# Altium footprint library MyPcbLib.PcbLib: 657 footprints (part 15 of 42)
Each footprint in its own frame and in the unit in brackets; x right, y up, seen from the top. Pads: shape width x height; smd on the part's side, far side on the other; paste and mask are expansions set on the pad; w line width, h text height; cw(c..) or ccw(c..) is an arc to the next point about the centre after c.
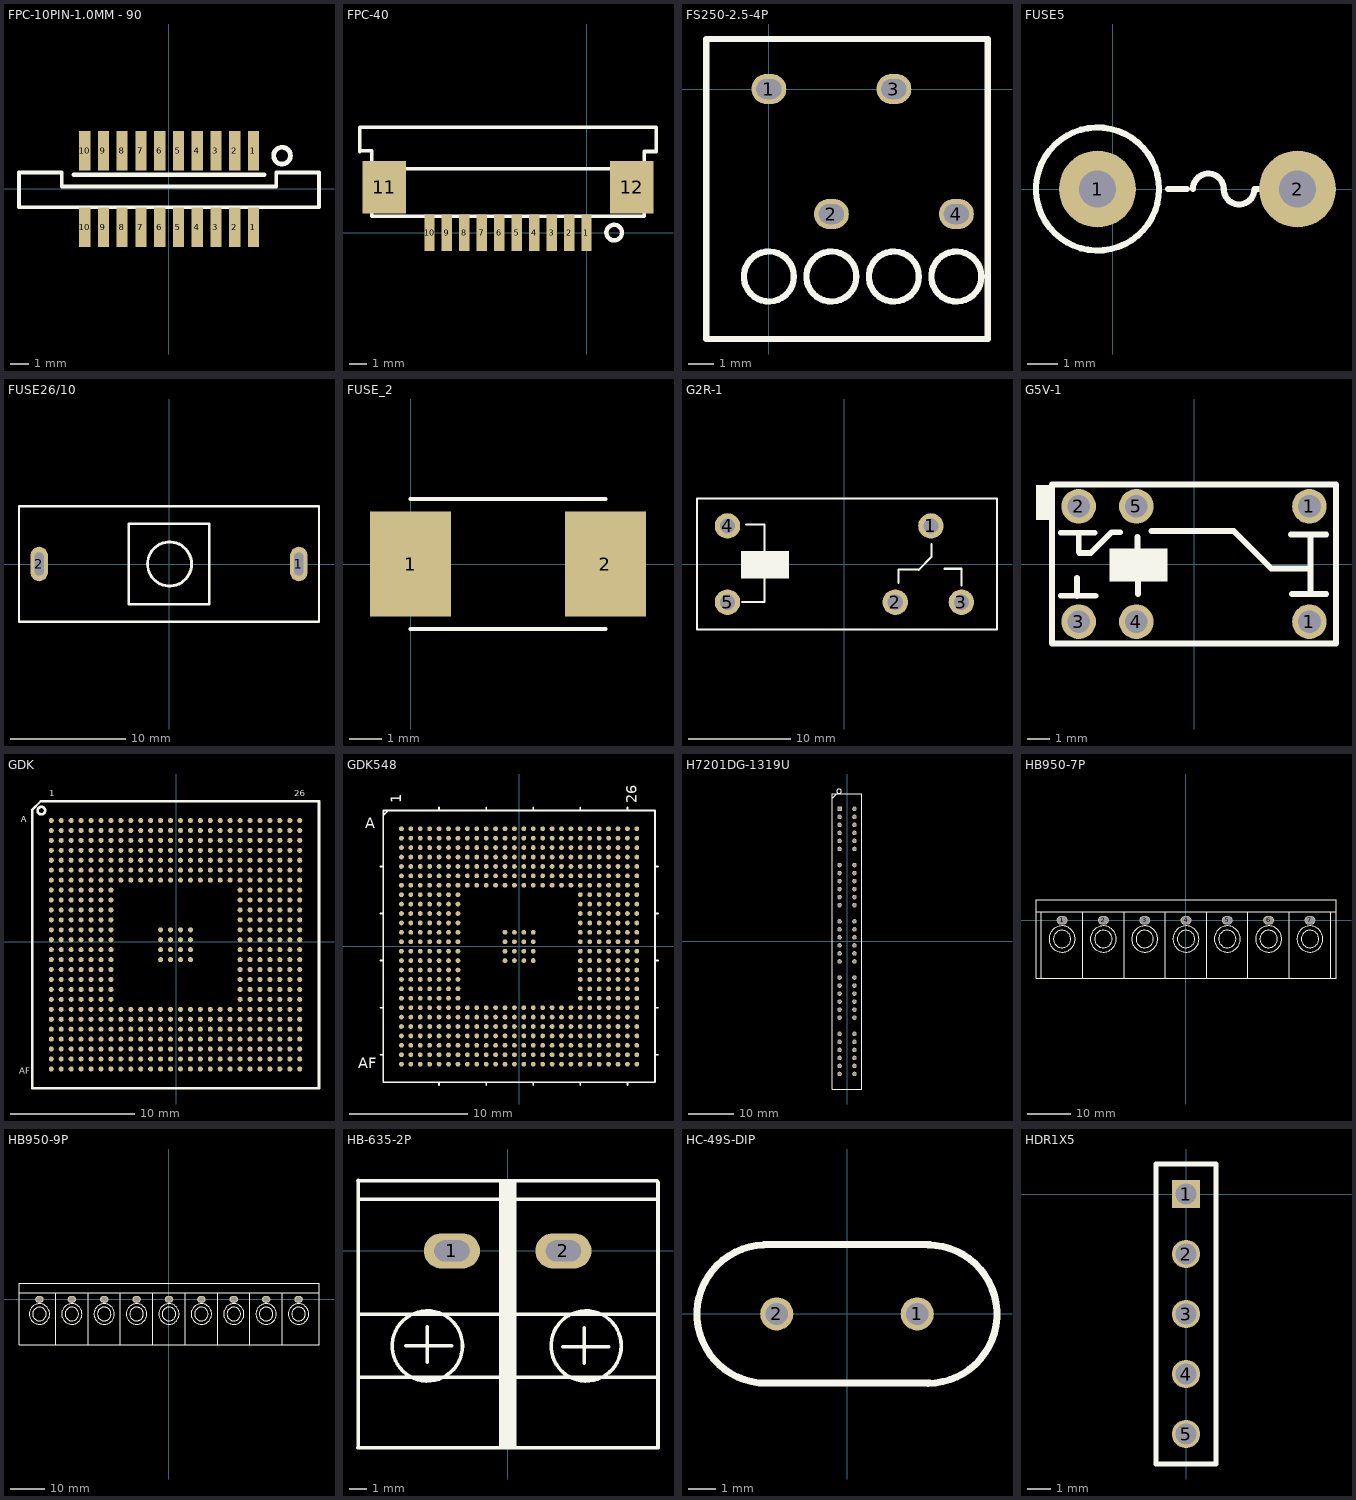
[diagram p14: the footprints below, top view; thin cyan lines are the x and y axes]

## FPC-10PIN-1.0MM - 90 [mm]
pads (20):
  rect 0.6x2.1 smd: 1(4.512,-2.033) 1(4.512,2.031) 2(3.512,-2.033) 2(3.512,2.031) 3(2.512,-2.033) 3(2.512,2.031) 4(1.512,-2.033) 4(1.512,2.031) 5(0.512,-2.033) 5(0.512,2.031) 6(-0.488,-2.033) 6(-0.488,2.031) 7(-1.488,-2.033) 7(-1.488,2.031) 8(-2.488,-2.033) 8(-2.488,2.031) 9(-3.488,-2.033) 9(-3.488,2.031) 10(-4.488,-2.033) 10(-4.488,2.031)
Top Overlay:
  circle w0.254: c6.042,1.777 r0.447
  lines w0.203: -7.988,-0.971 8.012,-0.971 8.012,0.887 5.728,0.887 5.728,0.127 -5.704,0.127 -5.704,0.887 -7.988,0.887 -7.988,-0.971
  lines w0.254: -5.068,0.761 5.092,0.761

## FPC-40 [mm]
pads (12):
  rect 0.6x2.1 smd: 1(-0.003,-0.001) 2(-1.003,-0.001) 3(-2.003,-0.001) 4(-3.003,-0.001) 5(-4.003,-0.001) 6(-5.003,-0.001) 7(-6.003,-0.001) 8(-7.003,-0.001) 9(-8.003,-0.001) 10(-9.003,-0.001)
  rect 2.5x3 smd: 11(-11.603,2.6) 12(2.597,2.6)
Top Overlay:
  circle w0.254: c1.585,0 r0.447
  lines w0.203: -12.303,4.249 -12.303,3.649 3.297,3.649 ; -12.303,4.649 -12.303,0.949 3.297,0.949 3.297,4.649 3.997,4.649 3.997,6.049 -13.003,6.049 -13.003,5.149 -13.003,4.649 -13.003,4.699 -12.303,4.699 ; 3.297,4.249 3.297,3.649 ; 3.297,3.649 3.297,3.649

## FS250-2.5-4P [mm]
pads (4):
  oval 1.4x1.2 hole 0.8 slot 1 at 0 deg: 1(0,0) 2(2.5,-5) 3(5,0) 4(7.5,-5)
Top Overlay:
  circle w0.254: c7.5,-7.5 r1
  circle w0.254: c5,-7.5 r1
  circle w0.254: c2.5,-7.5 r1
  circle w0.254: c0,-7.5 r1
  lines w0.254: -2.5,-10 8.75,-10 8.75,2 -2.5,2 -2.5,-10

## FUSE5 [mm]
pads (2):
  round 2.5 hole 1.2: 1(-0.5,0) 2(6,0)
Top Overlay:
  circle w0.2: c-0.5,0 r2
  lines w0.2: 1.8,0 2.4,0 ; 2.6,0 cw(c3.1,0) 3.6,0 ccw(c4.1,0) 4.6,0 6.1,0

## FUSE26/10 [mm]
pads (2):
  oval 1.5x3 hole 0.8 slot 2 at 90 deg: 1(11.25,0) 2(-11.25,0)
Top Overlay:
  circle w0.254: c0.051,0 r1.91
  lines w0.203: -13,-5 -13,5 13,5 13,-5 -13,-5 ; -3.5,-3.5 3.5,-3.5 3.5,3.5 -3.5,3.5 -3.5,-3.5
3D body: height 1, standoff -16, extent -11.532,-4.818 11.468,5.182

## FUSE_2 [mil]
pads (2):
  rect 100x130 smd: 1(0,0) 2(240,0)
Top Overlay:
  lines w5: 0,-80 240,-80 ; 0,80 240,80

## G2R-1 [mm] "OMRON G2R-1 1165h1"
pads (5):
  round 2.5 hole 1.5: 1(8.5,3.75) 2(5,-3.75) 3(11.5,-3.75) 4(-11.5,3.75) 5(-11.5,-3.75)
Top Overlay:
  rectangle: -10.185,-1.397 -5.461,1.27
  lines w0.203: -10.084,-3.734 -7.849,-3.734 -7.849,-1.575 ; -9.703,3.886 -7.874,3.886 -7.874,1.168 ; -7.874,-1.88 -7.874,1.194 -7.849,1.219 ; 5.309,-1.861 5.309,-0.515 7.366,-0.515 7.391,-0.49 ; 7.29,-0.566 8.56,0.704 8.56,1.974 ; 9.83,-0.464 11.506,-0.464 11.506,-2.09 ; 15,6.45 -14.5,6.45 -14.5,-6.45 15,-6.45 15,6.461
3D body: height 25.8, standoff -3.7, extent -13.916,-6.706 15.084,6.294

## G5V-1 [mil]
pads (6):
  round 60 hole 39.37: 1(200,-100) 1(200,100) 2(-200,100) 3(-200,-100) 4(-100,-100) 5(-100,100)
Top Overlay:
  rectangle: -274,76 -250,137
  rectangle: -147,-30 -46,27
  lines w10: -231,-55 -171,-55 ; -231,54 -172,54 ; -203,-56 -203,-24 ; -200,21 -200,30 ; -200,27 -200,52 ; -199,19 -179,19 -143,55 -128,55 ; -98,15 -98,47 ; -97,-52 -97,-23 ; -74,57 -46,57 ; -50,57 69,57 134,-8 200,-8 ; 168,51 229,51 ; 170,-52 229,-52 ; 202,-47 202,49 ; -246.06,-137.8 246.06,-137.8 246.06,137.8 -246.06,137.8 -246.06,-137.8

## GDK [mil]
pads (548):
  round 16 smd: A1(-395.7,383.7) A2(-364.2,383.7) A3(-332.71,383.7) A4(-301.21,383.7) A5(-269.72,383.7) A6(-238.22,383.7) A7(-206.72,383.7) A8(-175.23,383.7) A9(-143.73,383.7) A10(-112.24,383.7) A11(-80.74,383.7) A12(-49.24,383.7) A13(-17.75,383.7) A14(13.75,383.7) A15(45.24,383.7) A16(76.74,383.7) A17(108.24,383.7) A18(139.73,383.7) A19(171.23,383.7) A20(202.72,383.7) A21(234.22,383.7) A22(265.72,383.7) A23(297.21,383.7) A24(328.71,383.7) A25(360.2,383.7) A26(391.7,383.7) AA1(-395.7,-246.22) AA2(-364.2,-246.22) AA3(-332.71,-246.22) AA4(-301.21,-246.22) AA5(-269.72,-246.22) AA6(-238.22,-246.22) AA7(-206.72,-246.22) AA8(-175.23,-246.22) AA9(-143.73,-246.22) AA10(-112.24,-246.22) AA11(-80.74,-246.22) AA12(-49.24,-246.22) AA13(-17.75,-246.22) AA14(13.75,-246.22) AA15(45.24,-246.22) AA16(76.74,-246.22) AA17(108.24,-246.22) AA18(139.73,-246.22) AA19(171.23,-246.22) AA20(202.72,-246.22) AA21(234.22,-246.22) AA22(265.72,-246.22) AA23(297.21,-246.22) AA24(328.71,-246.22) AA25(360.2,-246.22) AA26(391.7,-246.22) AB1(-395.7,-277.72) AB2(-364.2,-277.72) AB3(-332.71,-277.72) AB4(-301.21,-277.72) AB5(-269.72,-277.72) AB6(-238.22,-277.72) AB7(-206.72,-277.72) AB8(-175.23,-277.72) AB9(-143.73,-277.72) AB10(-112.24,-277.72) AB11(-80.74,-277.72) AB12(-49.24,-277.72) AB13(-17.75,-277.72) AB14(13.75,-277.72) AB15(45.24,-277.72) AB16(76.74,-277.72) AB17(108.24,-277.72) AB18(139.73,-277.72) AB19(171.23,-277.72) AB20(202.72,-277.72) AB21(234.22,-277.72) AB22(265.72,-277.72) AB23(297.21,-277.72) AB24(328.71,-277.72) AB25(360.2,-277.72) AB26(391.7,-277.72) AC1(-395.7,-309.21) AC2(-364.2,-309.21) AC3(-332.71,-309.21) AC4(-301.21,-309.21) AC5(-269.72,-309.21) AC6(-238.22,-309.21) AC7(-206.72,-309.21) AC8(-175.23,-309.21) AC9(-143.73,-309.21) AC10(-112.24,-309.21) AC11(-80.74,-309.21) AC12(-49.24,-309.21) AC13(-17.75,-309.21) AC14(13.75,-309.21) AC15(45.24,-309.21) AC16(76.74,-309.21) AC17(108.24,-309.21) AC18(139.73,-309.21) AC19(171.23,-309.21) AC20(202.72,-309.21) AC21(234.22,-309.21) AC22(265.72,-309.21) AC23(297.21,-309.21) AC24(328.71,-309.21) AC25(360.2,-309.21) AC26(391.7,-309.21) AD1(-395.7,-340.71) AD2(-364.2,-340.71) AD3(-332.71,-340.71) AD4(-301.21,-340.71) AD5(-269.72,-340.71) AD6(-238.22,-340.71) AD7(-206.72,-340.71) AD8(-175.23,-340.71) AD9(-143.73,-340.71) AD10(-112.24,-340.71) AD11(-80.74,-340.71) AD12(-49.24,-340.71) AD13(-17.75,-340.71) AD14(13.75,-340.71) AD15(45.24,-340.71) AD16(76.74,-340.71) AD17(108.24,-340.71) AD18(139.73,-340.71) AD19(171.23,-340.71) AD20(202.72,-340.71) AD21(234.22,-340.71) AD22(265.72,-340.71) AD23(297.21,-340.71) AD24(328.71,-340.71) AD25(360.2,-340.71) AD26(391.7,-340.71) AE1(-395.7,-372.2) AE2(-364.2,-372.2) AE3(-332.71,-372.2) AE4(-301.21,-372.2) AE5(-269.72,-372.2) AE6(-238.22,-372.2) AE7(-206.72,-372.2) AE8(-175.23,-372.2) AE9(-143.73,-372.2) AE10(-112.24,-372.2) AE11(-80.74,-372.2) AE12(-49.24,-372.2) AE13(-17.75,-372.2) AE14(13.75,-372.2) AE15(45.24,-372.2) AE16(76.74,-372.2) AE17(108.24,-372.2) AE18(139.73,-372.2) AE19(171.23,-372.2) AE20(202.72,-372.2) AE21(234.22,-372.2) AE22(265.72,-372.2) AE23(297.21,-372.2) AE24(328.71,-372.2) AE25(360.2,-372.2) AE26(391.7,-372.2) AF1(-395.7,-403.7) AF2(-364.2,-403.7) AF3(-332.71,-403.7) AF4(-301.21,-403.7) AF5(-269.72,-403.7) AF6(-238.22,-403.7) AF7(-206.72,-403.7) AF8(-175.23,-403.7) AF9(-143.73,-403.7) AF10(-112.24,-403.7) AF11(-80.74,-403.7) AF12(-49.24,-403.7) AF13(-17.75,-403.7) AF14(13.75,-403.7) AF15(45.24,-403.7) AF16(76.74,-403.7) AF17(108.24,-403.7) AF18(139.73,-403.7) AF19(171.23,-403.7) AF20(202.72,-403.7) AF21(234.22,-403.7) AF22(265.72,-403.7) AF23(297.21,-403.7) AF24(328.71,-403.7) AF25(360.2,-403.7) AF26(391.7,-403.7) B1(-395.7,352.2) B2(-364.2,352.2) B3(-332.71,352.2) B4(-301.21,352.2) B5(-269.72,352.2) B6(-238.22,352.2) B7(-206.72,352.2) B8(-175.23,352.2) B9(-143.73,352.2) B10(-112.24,352.2) B11(-80.74,352.2) B12(-49.24,352.2) B13(-17.75,352.2) B14(13.75,352.2) B15(45.24,352.2) B16(76.74,352.2) B17(108.24,352.2) B18(139.73,352.2) B19(171.23,352.2) B20(202.72,352.2) B21(234.22,352.2) B22(265.72,352.2) B23(297.21,352.2) B24(328.71,352.2) B25(360.2,352.2) B26(391.7,352.2) C1(-395.7,320.71) C2(-364.2,320.71) C3(-332.71,320.71) C4(-301.21,320.71) C5(-269.72,320.71) C6(-238.22,320.71) C7(-206.72,320.71) C8(-175.23,320.71) C9(-143.73,320.71) C10(-112.24,320.71) C11(-80.74,320.71) C12(-49.24,320.71) C13(-17.75,320.71) C14(13.75,320.71) C15(45.24,320.71) C16(76.74,320.71) C17(108.24,320.71) C18(139.73,320.71) C19(171.23,320.71) C20(202.72,320.71) C21(234.22,320.71) C22(265.72,320.71) C23(297.21,320.71) C24(328.71,320.71) C25(360.2,320.71) C26(391.7,320.71) D1(-395.7,289.21) D2(-364.2,289.21) D3(-332.71,289.21) D4(-301.21,289.21) D5(-269.72,289.21) D6(-238.22,289.21) D7(-206.72,289.21) D8(-175.23,289.21) D9(-143.73,289.21) D10(-112.24,289.21) D11(-80.74,289.21) D12(-49.24,289.21) D13(-17.75,289.21) D14(13.75,289.21) D15(45.24,289.21) D16(76.74,289.21) D17(108.24,289.21) D18(139.73,289.21) D19(171.23,289.21) D20(202.72,289.21) D21(234.22,289.21) D22(265.72,289.21) D23(297.21,289.21) D24(328.71,289.21) D25(360.2,289.21) D26(391.7,289.21) E1(-395.7,257.72) E2(-364.2,257.72) E3(-332.71,257.72) E4(-301.21,257.72) E5(-269.72,257.72) E6(-238.22,257.72) E7(-206.72,257.72) E8(-175.23,257.72) E9(-143.73,257.72) E10(-112.24,257.72) E11(-80.74,257.72) E12(-49.24,257.72) E13(-17.75,257.72) E14(13.75,257.72) E15(45.24,257.72) E16(76.74,257.72) E17(108.24,257.72) E18(139.73,257.72) E19(171.23,257.72) E20(202.72,257.72) E21(234.22,257.72) E22(265.72,257.72) E23(297.21,257.72) E24(328.71,257.72) E25(360.2,257.72) E26(391.7,257.72) F1(-395.7,226.22) F2(-364.2,226.22) F3(-332.71,226.22) F4(-301.21,226.22) F5(-269.72,226.22) F6(-238.22,226.22) F7(-206.72,226.22) F8(-175.23,226.22) F9(-143.73,226.22) F10(-112.24,226.22) F11(-80.74,226.22) F12(-49.24,226.22) F13(-17.75,226.22) F14(13.75,226.22) F15(45.24,226.22) F16(76.74,226.22) F17(108.24,226.22) F18(139.73,226.22) F19(171.23,226.22) F20(202.72,226.22) F21(234.22,226.22) F22(265.72,226.22) F23(297.21,226.22) F24(328.71,226.22) F25(360.2,226.22) F26(391.7,226.22) G1(-395.7,194.72) G2(-364.2,194.72) G3(-332.71,194.72) G4(-301.21,194.72) G5(-269.72,194.72) G6(-238.22,194.72) G7(-206.72,194.72) G8(-175.23,194.72) G9(-143.73,194.72) G10(-112.24,194.72) G11(-80.74,194.72) G12(-49.24,194.72) G13(-17.75,194.72) G14(13.75,194.72) G15(45.24,194.72) G16(76.74,194.72) G17(108.24,194.72) G18(139.73,194.72) G19(171.23,194.72) G20(202.72,194.72) G21(234.22,194.72) G22(265.72,194.72) G23(297.21,194.72) G24(328.71,194.72) G25(360.2,194.72) G26(391.7,194.72) H1(-395.7,163.23) H2(-364.2,163.23) H3(-332.71,163.23) H4(-301.21,163.23) H5(-269.72,163.23) H6(-238.22,163.23) H7(-206.72,163.23) H20(202.72,163.23) H21(234.22,163.23) H22(265.72,163.23) H23(297.21,163.23) H24(328.71,163.23) H25(360.2,163.23) H26(391.7,163.23) J1(-395.7,131.73) J2(-364.2,131.73) J3(-332.71,131.73) J4(-301.21,131.73) J5(-269.72,131.73) J6(-238.22,131.73) J7(-206.72,131.73) J20(202.72,131.73) J21(234.22,131.73) J22(265.72,131.73) J23(297.21,131.73) J24(328.71,131.73) J25(360.2,131.73) J26(391.7,131.73) K1(-395.7,100.24) K2(-364.2,100.24) K3(-332.71,100.24) K4(-301.21,100.24) K5(-269.72,100.24) K6(-238.22,100.24) K7(-206.72,100.24) K20(202.72,100.24) K21(234.22,100.24) K22(265.72,100.24) K23(297.21,100.24) K24(328.71,100.24) K25(360.2,100.24) K26(391.7,100.24) L1(-395.7,68.74) L2(-364.2,68.74) L3(-332.71,68.74) L4(-301.21,68.74) L5(-269.72,68.74) L6(-238.22,68.74) L7(-206.72,68.74) L20(202.72,68.74) L21(234.22,68.74) L22(265.72,68.74) L23(297.21,68.74) L24(328.71,68.74) L25(360.2,68.74) L26(391.7,68.74) M1(-395.7,37.24) M2(-364.2,37.24) M3(-332.71,37.24) M4(-301.21,37.24) M5(-269.72,37.24) M6(-238.22,37.24) M7(-206.72,37.24) M12(-49.24,37.24) M13(-17.75,37.24) M14(13.75,37.24) M15(45.24,37.24) M20(202.72,37.24) M21(234.22,37.24) M22(265.72,37.24) M23(297.21,37.24) M24(328.71,37.24) M25(360.2,37.24) M26(391.7,37.24) N1(-395.7,5.75) N2(-364.2,5.75) N3(-332.71,5.75) N4(-301.21,5.75) N5(-269.72,5.75) N6(-238.22,5.75) N7(-206.72,5.75) N12(-49.24,5.75) N13(-17.75,5.75) N14(13.75,5.75) N15(45.24,5.75) N20(202.72,5.75) N21(234.22,5.75) N22(265.72,5.75) N23(297.21,5.75) N24(328.71,5.75) N25(360.2,5.75) N26(391.7,5.75) P1(-395.7,-25.75) P2(-364.2,-25.75) P3(-332.71,-25.75) P4(-301.21,-25.75) P5(-269.72,-25.75) P6(-238.22,-25.75) P7(-206.72,-25.75) P12(-49.24,-25.75) P13(-17.75,-25.75) P14(13.75,-25.75) P15(45.24,-25.75) P20(202.72,-25.75) P21(234.22,-25.75) P22(265.72,-25.75) P23(297.21,-25.75) P24(328.71,-25.75) P25(360.2,-25.75) P26(391.7,-25.75) R1(-395.7,-57.24) R2(-364.2,-57.24) R3(-332.71,-57.24) R4(-301.21,-57.24) R5(-269.72,-57.24) R6(-238.22,-57.24) R7(-206.72,-57.24) R12(-49.24,-57.24) R13(-17.75,-57.24) R14(13.75,-57.24) R15(45.24,-57.24) R20(202.72,-57.24) R21(234.22,-57.24) R22(265.72,-57.24) R23(297.21,-57.24) R24(328.71,-57.24) R25(360.2,-57.24) R26(391.7,-57.24) T1(-395.7,-88.74) T2(-364.2,-88.74) T3(-332.71,-88.74) T4(-301.21,-88.74) T5(-269.72,-88.74) T6(-238.22,-88.74) T7(-206.72,-88.74) T20(202.72,-88.74) T21(234.22,-88.74) T22(265.72,-88.74) T23(297.21,-88.74) T24(328.71,-88.74) T25(360.2,-88.74) T26(391.7,-88.74) U1(-395.7,-120.24) U2(-364.2,-120.24) U3(-332.71,-120.24) U4(-301.21,-120.24) U5(-269.72,-120.24) U6(-238.22,-120.24) U7(-206.72,-120.24) U20(202.72,-120.24) U21(234.22,-120.24) U22(265.72,-120.24) U23(297.21,-120.24) U24(328.71,-120.24) U25(360.2,-120.24) U26(391.7,-120.24) V1(-395.7,-151.73) V2(-364.2,-151.73) V3(-332.71,-151.73) V4(-301.21,-151.73) V5(-269.72,-151.73) V6(-238.22,-151.73) V7(-206.72,-151.73) V20(202.72,-151.73) V21(234.22,-151.73) V22(265.72,-151.73) V23(297.21,-151.73) V24(328.71,-151.73) V25(360.2,-151.73) V26(391.7,-151.73) W1(-395.7,-183.23) W2(-364.2,-183.23) W3(-332.71,-183.23) W4(-301.21,-183.23) W5(-269.72,-183.23) W6(-238.22,-183.23) W7(-206.72,-183.23) W20(202.72,-183.23) W21(234.22,-183.23) W22(265.72,-183.23) W23(297.21,-183.23) W24(328.71,-183.23) W25(360.2,-183.23) W26(391.7,-183.23) Y1(-395.7,-214.72) Y2(-364.2,-214.72) Y3(-332.71,-214.72) Y4(-301.21,-214.72) Y5(-269.72,-214.72) Y6(-238.22,-214.72) Y7(-206.72,-214.72) Y8(-175.23,-214.72) Y9(-143.73,-214.72) Y10(-112.24,-214.72) Y11(-80.74,-214.72) Y12(-49.24,-214.72) Y13(-17.75,-214.72) Y14(13.75,-214.72) Y15(45.24,-214.72) Y16(76.74,-214.72) Y17(108.24,-214.72) Y18(139.73,-214.72) Y19(171.23,-214.72) Y20(202.72,-214.72) Y21(234.22,-214.72) Y22(265.72,-214.72) Y23(297.21,-214.72) Y24(328.71,-214.72) Y25(360.2,-214.72) Y26(391.7,-214.72)
Top Overlay:
  circle w8: c-427,415 r12
  lines w8: -456.72,-464.72 -456.72,417.17 -429.17,444.72 452.72,444.72 452.72,-464.72 -456.72,-464.72
  text "A" at -474,378 h20
  text "1" at -402,461 h20
  text "26" at 375,460 h20
  text "AF" at -498,-419 h20
3D body: height 122.05, standoff -5.91, extent -456,-465.72 453.45,443.72

## GDK548 [mm]
height 2.794
pads (548):
  round 0.406 smd: A1(-10,10) A2(-9.2,10) A3(-8.4,10) A4(-7.6,10) A5(-6.8,10) A6(-6,10) A7(-5.2,10) A8(-4.4,10) A9(-3.6,10) A10(-2.8,10) A11(-2,10) A12(-1.2,10) A13(-0.4,10) A14(0.4,10) A15(1.2,10) A16(2,10) A17(2.8,10) A18(3.6,10) A19(4.4,10) A20(5.2,10) A21(6,10) A22(6.8,10) A23(7.6,10) A24(8.4,10) A25(9.2,10) A26(10,10) AA1(-10,-6) AA2(-9.2,-6) AA3(-8.4,-6) AA4(-7.6,-6) AA5(-6.8,-6) AA6(-6,-6) AA7(-5.2,-6) AA8(-4.4,-6) AA9(-3.6,-6) AA10(-2.8,-6) AA11(-2,-6) AA12(-1.2,-6) AA13(-0.4,-6) AA14(0.4,-6) AA15(1.2,-6) AA16(2,-6) AA17(2.8,-6) AA18(3.6,-6) AA19(4.4,-6) AA20(5.2,-6) AA21(6,-6) AA22(6.8,-6) AA23(7.6,-6) AA24(8.4,-6) AA25(9.2,-6) AA26(10,-6) AB1(-10,-6.8) AB2(-9.2,-6.8) AB3(-8.4,-6.8) AB4(-7.6,-6.8) AB5(-6.8,-6.8) AB6(-6,-6.8) AB7(-5.2,-6.8) AB8(-4.4,-6.8) AB9(-3.6,-6.8) AB10(-2.8,-6.8) AB11(-2,-6.8) AB12(-1.2,-6.8) AB13(-0.4,-6.8) AB14(0.4,-6.8) AB15(1.2,-6.8) AB16(2,-6.8) AB17(2.8,-6.8) AB18(3.6,-6.8) AB19(4.4,-6.8) AB20(5.2,-6.8) AB21(6,-6.8) AB22(6.8,-6.8) AB23(7.6,-6.8) AB24(8.4,-6.8) AB25(9.2,-6.8) AB26(10,-6.8) AC1(-10,-7.6) AC2(-9.2,-7.6) AC3(-8.4,-7.6) AC4(-7.6,-7.6) AC5(-6.8,-7.6) AC6(-6,-7.6) AC7(-5.2,-7.6) AC8(-4.4,-7.6) AC9(-3.6,-7.6) AC10(-2.8,-7.6) AC11(-2,-7.6) AC12(-1.2,-7.6) AC13(-0.4,-7.6) AC14(0.4,-7.6) AC15(1.2,-7.6) AC16(2,-7.6) AC17(2.8,-7.6) AC18(3.6,-7.6) AC19(4.4,-7.6) AC20(5.2,-7.6) AC21(6,-7.6) AC22(6.8,-7.6) AC23(7.6,-7.6) AC24(8.4,-7.6) AC25(9.2,-7.6) AC26(10,-7.6) AD1(-10,-8.4) AD2(-9.2,-8.4) AD3(-8.4,-8.4) AD4(-7.6,-8.4) AD5(-6.8,-8.4) AD6(-6,-8.4) AD7(-5.2,-8.4) AD8(-4.4,-8.4) AD9(-3.6,-8.4) AD10(-2.8,-8.4) AD11(-2,-8.4) AD12(-1.2,-8.4) AD13(-0.4,-8.4) AD14(0.4,-8.4) AD15(1.2,-8.4) AD16(2,-8.4) AD17(2.8,-8.4) AD18(3.6,-8.4) AD19(4.4,-8.4) AD20(5.2,-8.4) AD21(6,-8.4) AD22(6.8,-8.4) AD23(7.6,-8.4) AD24(8.4,-8.4) AD25(9.2,-8.4) AD26(10,-8.4) AE1(-10,-9.2) AE2(-9.2,-9.2) AE3(-8.4,-9.2) AE4(-7.6,-9.2) AE5(-6.8,-9.2) AE6(-6,-9.2) AE7(-5.2,-9.2) AE8(-4.4,-9.2) AE9(-3.6,-9.2) AE10(-2.8,-9.2) AE11(-2,-9.2) AE12(-1.2,-9.2) AE13(-0.4,-9.2) AE14(0.4,-9.2) AE15(1.2,-9.2) AE16(2,-9.2) AE17(2.8,-9.2) AE18(3.6,-9.2) AE19(4.4,-9.2) AE20(5.2,-9.2) AE21(6,-9.2) AE22(6.8,-9.2) AE23(7.6,-9.2) AE24(8.4,-9.2) AE25(9.2,-9.2) AE26(10,-9.2) AF1(-10,-10) AF2(-9.2,-10) AF3(-8.4,-10) AF4(-7.6,-10) AF5(-6.8,-10) AF6(-6,-10) AF7(-5.2,-10) AF8(-4.4,-10) AF9(-3.6,-10) AF10(-2.8,-10) AF11(-2,-10) AF12(-1.2,-10) AF13(-0.4,-10) AF14(0.4,-10) AF15(1.2,-10) AF16(2,-10) AF17(2.8,-10) AF18(3.6,-10) AF19(4.4,-10) AF20(5.2,-10) AF21(6,-10) AF22(6.8,-10) AF23(7.6,-10) AF24(8.4,-10) AF25(9.2,-10) AF26(10,-10) B1(-10,9.2) B2(-9.2,9.2) B3(-8.4,9.2) B4(-7.6,9.2) B5(-6.8,9.2) B6(-6,9.2) B7(-5.2,9.2) B8(-4.4,9.2) B9(-3.6,9.2) B10(-2.8,9.2) B11(-2,9.2) B12(-1.2,9.2) B13(-0.4,9.2) B14(0.4,9.2) B15(1.2,9.2) B16(2,9.2) B17(2.8,9.2) B18(3.6,9.2) B19(4.4,9.2) B20(5.2,9.2) B21(6,9.2) B22(6.8,9.2) B23(7.6,9.2) B24(8.4,9.2) B25(9.2,9.2) B26(10,9.2) C1(-10,8.4) C2(-9.2,8.4) C3(-8.4,8.4) C4(-7.6,8.4) C5(-6.8,8.4) C6(-6,8.4) C7(-5.2,8.4) C8(-4.4,8.4) C9(-3.6,8.4) C10(-2.8,8.4) C11(-2,8.4) C12(-1.2,8.4) C13(-0.4,8.4) C14(0.4,8.4) C15(1.2,8.4) C16(2,8.4) C17(2.8,8.4) C18(3.6,8.4) C19(4.4,8.4) C20(5.2,8.4) C21(6,8.4) C22(6.8,8.4) C23(7.6,8.4) C24(8.4,8.4) C25(9.2,8.4) C26(10,8.4) D1(-10,7.6) D2(-9.2,7.6) D3(-8.4,7.6) D4(-7.6,7.6) D5(-6.8,7.6) D6(-6,7.6) D7(-5.2,7.6) D8(-4.4,7.6) D9(-3.6,7.6) D10(-2.8,7.6) D11(-2,7.6) D12(-1.2,7.6) D13(-0.4,7.6) D14(0.4,7.6) D15(1.2,7.6) D16(2,7.6) D17(2.8,7.6) D18(3.6,7.6) D19(4.4,7.6) D20(5.2,7.6) D21(6,7.6) D22(6.8,7.6) D23(7.6,7.6) D24(8.4,7.6) D25(9.2,7.6) D26(10,7.6) E1(-10,6.8) E2(-9.2,6.8) E3(-8.4,6.8) E4(-7.6,6.8) E5(-6.8,6.8) E6(-6,6.8) E7(-5.2,6.8) E8(-4.4,6.8) E9(-3.6,6.8) E10(-2.8,6.8) E11(-2,6.8) E12(-1.2,6.8) E13(-0.4,6.8) E14(0.4,6.8) E15(1.2,6.8) E16(2,6.8) E17(2.8,6.8) E18(3.6,6.8) E19(4.4,6.8) E20(5.2,6.8) E21(6,6.8) E22(6.8,6.8) E23(7.6,6.8) E24(8.4,6.8) E25(9.2,6.8) E26(10,6.8) F1(-10,6) F2(-9.2,6) F3(-8.4,6) F4(-7.6,6) F5(-6.8,6) F6(-6,6) F7(-5.2,6) F8(-4.4,6) F9(-3.6,6) F10(-2.8,6) F11(-2,6) F12(-1.2,6) F13(-0.4,6) F14(0.4,6) F15(1.2,6) F16(2,6) F17(2.8,6) F18(3.6,6) F19(4.4,6) F20(5.2,6) F21(6,6) F22(6.8,6) F23(7.6,6) F24(8.4,6) F25(9.2,6) F26(10,6) G1(-10,5.2) G2(-9.2,5.2) G3(-8.4,5.2) G4(-7.6,5.2) G5(-6.8,5.2) G6(-6,5.2) G7(-5.2,5.2) G8(-4.4,5.2) G9(-3.6,5.2) G10(-2.8,5.2) G11(-2,5.2) G12(-1.2,5.2) G13(-0.4,5.2) G14(0.4,5.2) G15(1.2,5.2) G16(2,5.2) G17(2.8,5.2) G18(3.6,5.2) G19(4.4,5.2) G20(5.2,5.2) G21(6,5.2) G22(6.8,5.2) G23(7.6,5.2) G24(8.4,5.2) G25(9.2,5.2) G26(10,5.2) H1(-10,4.4) H2(-9.2,4.4) H3(-8.4,4.4) H4(-7.6,4.4) H5(-6.8,4.4) H6(-6,4.4) H7(-5.2,4.4) H20(5.2,4.4) H21(6,4.4) H22(6.8,4.4) H23(7.6,4.4) H24(8.4,4.4) H25(9.2,4.4) H26(10,4.4) J1(-10,3.6) J2(-9.2,3.6) J3(-8.4,3.6) J4(-7.6,3.6) J5(-6.8,3.6) J6(-6,3.6) J7(-5.2,3.6) J20(5.2,3.6) J21(6,3.6) J22(6.8,3.6) J23(7.6,3.6) J24(8.4,3.6) J25(9.2,3.6) J26(10,3.6) K1(-10,2.8) K2(-9.2,2.8) K3(-8.4,2.8) K4(-7.6,2.8) K5(-6.8,2.8) K6(-6,2.8) K7(-5.2,2.8) K20(5.2,2.8) K21(6,2.8) K22(6.8,2.8) K23(7.6,2.8) K24(8.4,2.8) K25(9.2,2.8) K26(10,2.8) L1(-10,2) L2(-9.2,2) L3(-8.4,2) L4(-7.6,2) L5(-6.8,2) L6(-6,2) L7(-5.2,2) L20(5.2,2) L21(6,2) L22(6.8,2) L23(7.6,2) L24(8.4,2) L25(9.2,2) L26(10,2) M1(-10,1.2) M2(-9.2,1.2) M3(-8.4,1.2) M4(-7.6,1.2) M5(-6.8,1.2) M6(-6,1.2) M7(-5.2,1.2) M12(-1.2,1.2) M13(-0.4,1.2) M14(0.4,1.2) M15(1.2,1.2) M20(5.2,1.2) M21(6,1.2) M22(6.8,1.2) M23(7.6,1.2) M24(8.4,1.2) M25(9.2,1.2) M26(10,1.2) N1(-10,0.4) N2(-9.2,0.4) N3(-8.4,0.4) N4(-7.6,0.4) N5(-6.8,0.4) N6(-6,0.4) N7(-5.2,0.4) N12(-1.2,0.4) N13(-0.4,0.4) N14(0.4,0.4) N15(1.2,0.4) N20(5.2,0.4) N21(6,0.4) N22(6.8,0.4) N23(7.6,0.4) N24(8.4,0.4) N25(9.2,0.4) N26(10,0.4) P1(-10,-0.4) P2(-9.2,-0.4) P3(-8.4,-0.4) P4(-7.6,-0.4) P5(-6.8,-0.4) P6(-6,-0.4) P7(-5.2,-0.4) P12(-1.2,-0.4) P13(-0.4,-0.4) P14(0.4,-0.4) P15(1.2,-0.4) P20(5.2,-0.4) P21(6,-0.4) P22(6.8,-0.4) P23(7.6,-0.4) P24(8.4,-0.4) P25(9.2,-0.4) P26(10,-0.4) R1(-10,-1.2) R2(-9.2,-1.2) R3(-8.4,-1.2) R4(-7.6,-1.2) R5(-6.8,-1.2) R6(-6,-1.2) R7(-5.2,-1.2) R12(-1.2,-1.2) R13(-0.4,-1.2) R14(0.4,-1.2) R15(1.2,-1.2) R20(5.2,-1.2) R21(6,-1.2) R22(6.8,-1.2) R23(7.6,-1.2) R24(8.4,-1.2) R25(9.2,-1.2) R26(10,-1.2) T1(-10,-2) T2(-9.2,-2) T3(-8.4,-2) T4(-7.6,-2) T5(-6.8,-2) T6(-6,-2) T7(-5.2,-2) T20(5.2,-2) T21(6,-2) T22(6.8,-2) T23(7.6,-2) T24(8.4,-2) T25(9.2,-2) T26(10,-2) U1(-10,-2.8) U2(-9.2,-2.8) U3(-8.4,-2.8) U4(-7.6,-2.8) U5(-6.8,-2.8) U6(-6,-2.8) U7(-5.2,-2.8) U20(5.2,-2.8) U21(6,-2.8) U22(6.8,-2.8) U23(7.6,-2.8) U24(8.4,-2.8) U25(9.2,-2.8) U26(10,-2.8) V1(-10,-3.6) V2(-9.2,-3.6) V3(-8.4,-3.6) V4(-7.6,-3.6) V5(-6.8,-3.6) V6(-6,-3.6) V7(-5.2,-3.6) V20(5.2,-3.6) V21(6,-3.6) V22(6.8,-3.6) V23(7.6,-3.6) V24(8.4,-3.6) V25(9.2,-3.6) V26(10,-3.6) W1(-10,-4.4) W2(-9.2,-4.4) W3(-8.4,-4.4) W4(-7.6,-4.4) W5(-6.8,-4.4) W6(-6,-4.4) W7(-5.2,-4.4) W20(5.2,-4.4) W21(6,-4.4) W22(6.8,-4.4) W23(7.6,-4.4) W24(8.4,-4.4) W25(9.2,-4.4) W26(10,-4.4) Y1(-10,-5.2) Y2(-9.2,-5.2) Y3(-8.4,-5.2) Y4(-7.6,-5.2) Y5(-6.8,-5.2) Y6(-6,-5.2) Y7(-5.2,-5.2) Y8(-4.4,-5.2) Y9(-3.6,-5.2) Y10(-2.8,-5.2) Y11(-2,-5.2) Y12(-1.2,-5.2) Y13(-0.4,-5.2) Y14(0.4,-5.2) Y15(1.2,-5.2) Y16(2,-5.2) Y17(2.8,-5.2) Y18(3.6,-5.2) Y19(4.4,-5.2) Y20(5.2,-5.2) Y21(6,-5.2) Y22(6.8,-5.2) Y23(7.6,-5.2) Y24(8.4,-5.2) Y25(9.2,-5.2) Y26(10,-5.2)
Top Overlay:
  lines w0.152: -11.798,-9.2 -11.544,-9.2 ; -11.798,-5.2 -11.544,-5.2 ; -11.798,-1.2 -11.544,-1.2 ; -11.798,2.8 -11.544,2.8 ; -11.798,6.8 -11.544,6.8 ; -11.544,11.144 -11.144,11.544 ; -6.8,-11.798 -6.8,-11.544 ; -6.8,11.544 -6.8,11.798 ; -2.8,-11.798 -2.8,-11.544 ; -2.8,11.544 -2.8,11.798 ; 1.2,-11.798 1.2,-11.544 ; 1.2,11.544 1.2,11.798 ; 5.2,-11.798 5.2,-11.544 ; 5.2,11.544 5.2,11.798 ; 9.2,-11.798 9.2,-11.544 ; 9.2,11.544 9.2,11.798 ; 11.544,-9.2 11.798,-9.2 ; 11.544,-5.2 11.798,-5.2 ; 11.544,-1.2 11.798,-1.2 ; 11.544,2.8 11.798,2.8 ; 11.544,6.8 11.798,6.8 ; -11.544,-11.544 -11.544,11.544 11.544,11.544 11.544,-11.544 -11.544,-11.544
  text "26" at 10,12.179 h0.89
  text "1" at -10,12.179 h0.89
  text "AF" at -13.691,-10.363 h0.89
  text "A" at -13.081,10.033 h0.89

## H7201DG-1319U [mm]
pads (60):
  rect 1x1 hole 0.7: 1(-1.65,29.37)
  round 1 hole 0.7: 2(-1.65,27.59) 3(-1.65,25.81) 4(-1.65,24.03) 5(-1.65,22.25) 6(-1.65,20.47) 7(-1.65,16.91) 8(-1.65,15.13) 9(-1.65,13.35) 10(-1.65,11.57) 11(-1.65,9.79) 12(-1.65,8.01) 13(-1.65,4.45) 14(-1.65,2.67) 15(-1.65,0.89) 16(-1.65,-0.89) 17(-1.65,-2.67) 18(-1.65,-4.45) 19(-1.65,-8.01) 20(-1.65,-9.79) 21(-1.65,-11.57) 22(-1.65,-13.35) 23(-1.65,-15.13) 24(-1.65,-16.91) 25(-1.65,-20.47) 26(-1.65,-22.25) 27(-1.65,-24.03) 28(-1.65,-25.81) 29(-1.65,-27.59) 30(-1.65,-29.37) 31(1.65,-29.37) 32(1.65,-27.59) 33(1.65,-25.81) 34(1.65,-24.03) 35(1.65,-22.25) 36(1.65,-20.47) 37(1.65,-16.91) 38(1.65,-15.13) 39(1.65,-13.35) 40(1.65,-11.57) 41(1.65,-9.79) 42(1.65,-8.01) 43(1.65,-4.45) 44(1.65,-2.67) 45(1.65,-0.89) 46(1.65,0.89) 47(1.65,2.67) 48(1.65,4.45) 49(1.65,8.01) 50(1.65,9.79) 51(1.65,11.57) 52(1.65,13.35) 53(1.65,15.13) 54(1.65,16.91) 55(1.65,20.47) 56(1.65,22.25) 57(1.65,24.03) 58(1.65,25.81) 59(1.65,27.59) 60(1.65,29.37)
Top Overlay:
  circle w0.254: c-1.75,33.25 r0.5
  lines w0.203: -3.25,31.7 -2.25,32.7 ; -3.25,-32.7 3.25,-32.7 3.25,32.7 -3.25,32.7 -3.25,-32.7
Bottom Overlay:
  lines w0.203: -3.25,-18.69 3.25,-18.69 ; -3.25,-6.23 1.65,-6.23 3.25,-6.23 ; -3.25,6.23 3.25,6.23 ; -3.25,18.69 3.25,18.69

## HB950-7P [mm]
pads (7):
  oval 2.5x2 / inner oval 2.5x2 / far side oval 3.5x2.5 hole 1.6 slot 2 at 0 deg: 1(-28.5,0) 2(-19,0) 3(-9.5,0) 4(0,0) 5(9.507,0) 6(19,0) 7(28.5,0)
Top Overlay:
  circle w0.203: c-9.5,-4.3 r2
  circle w0.203: c0,-4.3 r2
  circle w0.203: c9.5,-4.3 r2
  circle w0.203: c19,-4.3 r2
  circle w0.203: c28.5,-4.3 r2
  circle w0.203: c-19,-4.3 r2
  circle w0.203: c-28.5,-4.3 r2
  circle w0.203: c28.5,-4.3 r3
  circle w0.203: c19,-4.3 r3
  circle w0.203: c9.5,-4.3 r3
  circle w0.203: c0,-4.3 r3
  circle w0.203: c-9.5,-4.3 r3
  circle w0.203: c-19,-4.3 r3
  circle w0.203: c-28.5,-4.3 r3
  lines w0.203: -34.493,2 34.493,2 ; -33.25,-13.3 -33.25,2 ; -23.75,-13.3 -23.75,0 -23.75,2 ; -14.25,-13.3 -14.25,2 ; -4.75,-13.3 -4.75,2 ; 4.75,-13.3 4.75,2 ; 14.25,-13.3 14.25,2 ; 23.75,-13.3 23.75,2 ; 33.25,-13.3 33.25,2 ; 34.493,4.686 34.493,-13.3 -34.493,-13.3 -34.493,4.7 34.493,4.7

## HB950-9P [mm]
pads (9):
  oval 2.5x2 hole 1.2 slot 1.5 at 0 deg: 1(-38,0) 2(-28.5,0) 3(-19,0) 4(-9.5,0) 5(0.007,0) 6(9.5,0) 7(19,0) 8(28.5,0) 9(38,0)
Top Overlay:
  circle w0.203: c-38,-4.3 r3
  circle w0.203: c-28.5,-4.3 r3
  circle w0.203: c-19,-4.3 r3
  circle w0.203: c-9.5,-4.3 r3
  circle w0.203: c0,-4.3 r3
  circle w0.203: c9.5,-4.3 r3
  circle w0.203: c19,-4.3 r3
  circle w0.203: c28.5,-4.3 r3
  circle w0.203: c38,-4.3 r3
  circle w0.203: c-38,-4.3 r2
  circle w0.203: c-28.5,-4.3 r2
  circle w0.203: c38,-4.3 r2
  circle w0.203: c28.5,-4.3 r2
  circle w0.203: c19,-4.3 r2
  circle w0.203: c9.5,-4.3 r2
  circle w0.203: c0,-4.3 r2
  circle w0.203: c-9.5,-4.3 r2
  circle w0.203: c-19,-4.3 r2
  lines w0.203: -43.993,2 44.007,2 ; -33.25,-13.3 -33.25,0 -33.25,2 ; -23.75,-13.3 -23.75,2 ; -14.25,-13.3 -14.25,2 ; -4.75,-13.3 -4.75,2 ; 4.75,-13.3 4.75,2 ; 14.25,-13.3 14.25,2 ; 23.75,-13.3 23.75,2 ; 33.25,-13.3 33.25,2 ; 44.007,4.686 44.007,-13.3 -43.993,-13.3 -43.993,4.7 44.007,4.7

## HB-635-2P [mm]
pads (2):
  oval 3.2x2 hole 1.2 slot 2 at 0 deg: 1(-3.175,0) 2(3.175,0)
Top Overlay:
  circle w0.203: c-4.574,-5.41 r2
  circle w0.203: c4.468,-5.41 r2
  rectangle: -0.5,-11.2 0.5,4
  lines w0.203: -8.525,-11.2 8.525,-11.2 ; -8.525,4 8.525,4 ; -8.509,-11.2 -8.509,4.013 ; -8.509,-7.2 8.534,-7.2 ; -8.509,-3.6 8.56,-3.6 ; -8.484,2.946 8.56,2.946 ; -5.817,-5.41 -3.175,-5.41 ; -4.572,-6.35 -4.572,-4.318 ; 3.124,-5.461 5.766,-5.461 ; 4.369,-6.401 4.369,-4.369 ; 8.56,-11.2 8.56,3.912

## HC-49S-DIP [mm]
pads (2):
  round 1.2 hole 0.8: 1(2.54,0) 2(-2.54,0)
Top Overlay:
  lines w0.254: -3.014,2.491 ccw(c-2.921,-0.007) -2.921,-2.507 ; -3,-2.5 3,-2.5 ; -3,2.5 3,2.5 ; 2.921,-2.511 ccw(c2.921,-0.011) 2.921,2.489
3D body: height 3.5, standoff -3, extent -5.514,-2.049 5.486,2.151

## HDR1X5 [mm]
pads (5):
  rect 1.2x1.2 hole 0.9: 1(0,0)
  round 1.2 hole 0.9: 2(0,-2.54) 3(0,-5.08) 4(0,-7.62) 5(0,-10.16)
Top Overlay:
  lines w0.2: -1.27,-11.43 1.27,-11.43 1.27,1.27 -1.27,1.27 -1.27,-11.43